# Altium footprint library MYLIB.PcbLib: 600 footprints (part 24 of 39)
Each footprint in its own frame and in the unit in brackets; x right, y up, seen from the top. Pads: shape width x height; smd on the part's side, far side on the other; paste and mask are expansions set on the pad; w line width, h text height; cw(c..) or ccw(c..) is an arc to the next point about the centre after c.
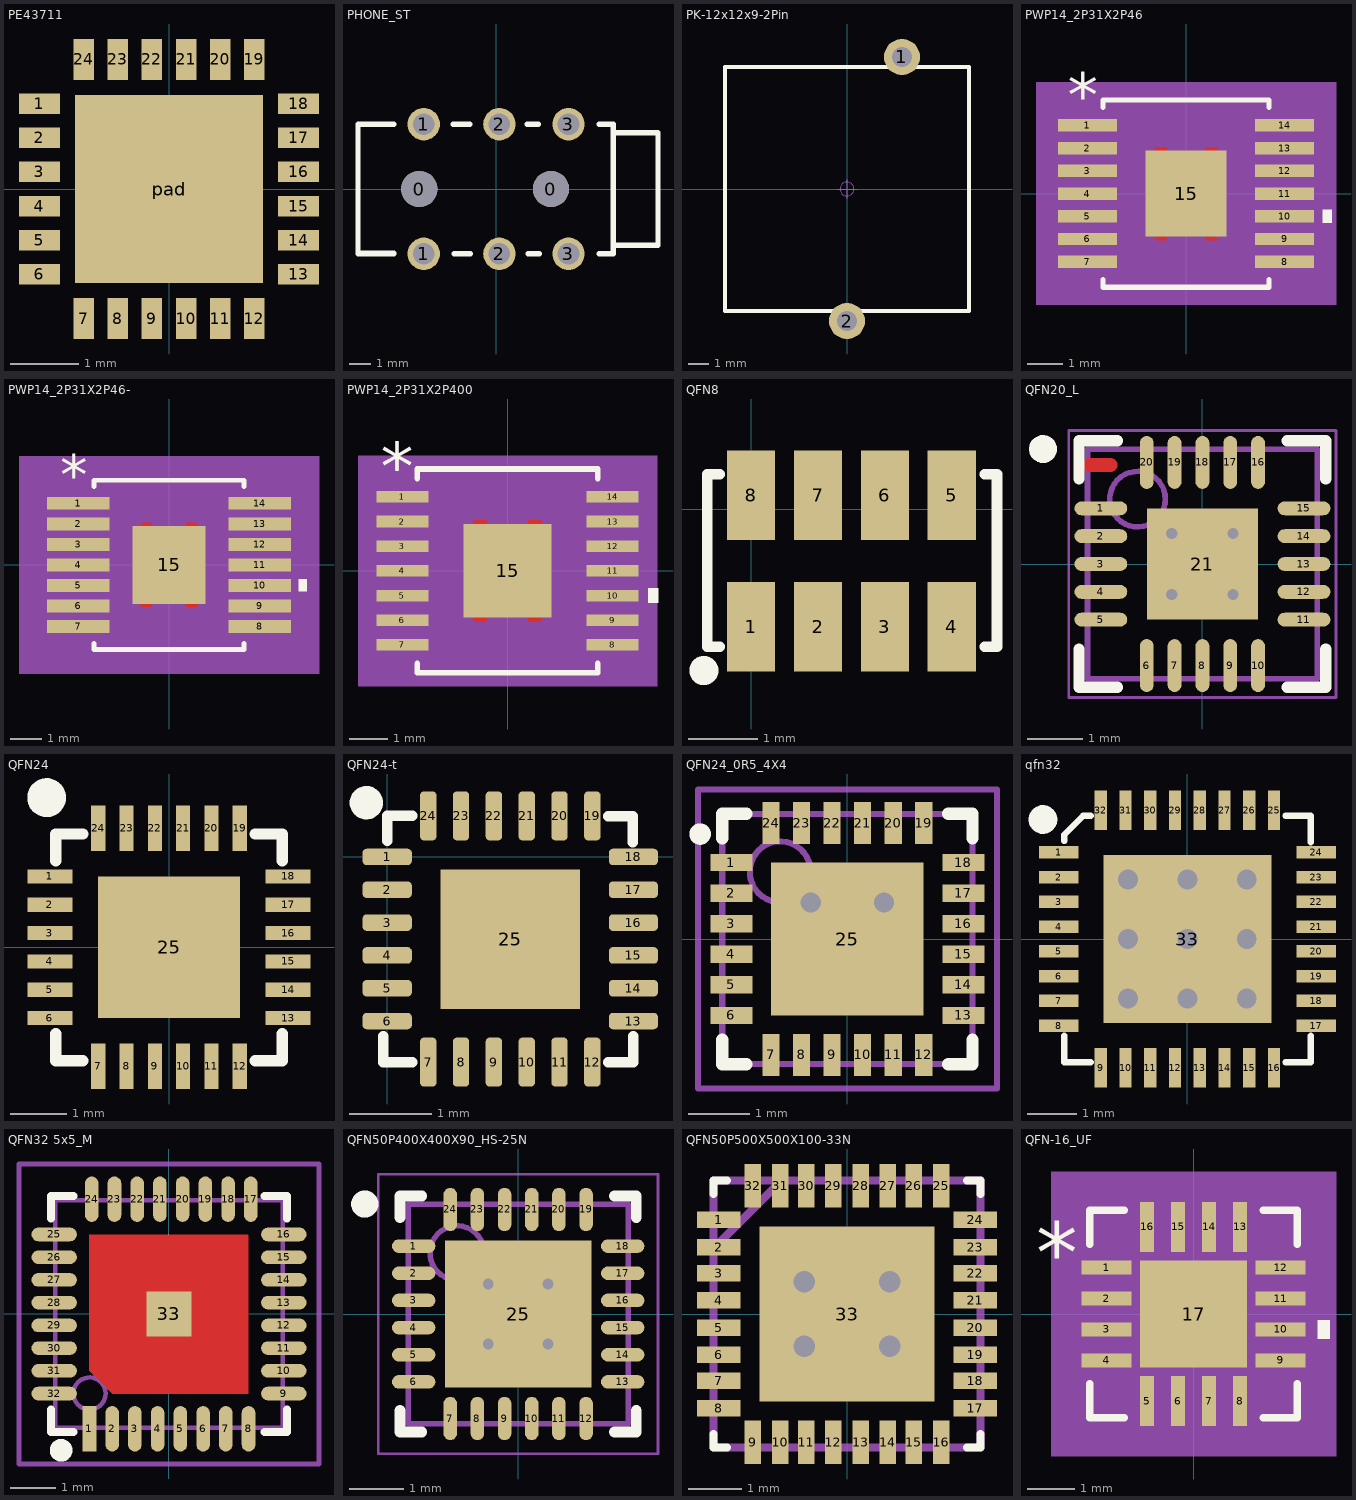
[diagram p23: the footprints below, top view; thin cyan lines are the x and y axes]

## PE43711 [mm] "5V"
pads (25):
  rect 0.6x0.3 smd: 1(-1.9,1.25) 2(-1.9,0.75) 3(-1.9,0.25) 4(-1.9,-0.25) 5(-1.9,-0.75) 6(-1.9,-1.25) 13(1.9,-1.25) 14(1.9,-0.75) 15(1.9,-0.25) 16(1.9,0.25) 17(1.9,0.75) 18(1.9,1.25)
  rect 0.3x0.6 smd: 7(-1.25,-1.9) 8(-0.75,-1.9) 9(-0.25,-1.9) 10(0.25,-1.9) 11(0.75,-1.9) 12(1.25,-1.9) 19(1.25,1.9) 20(0.75,1.9) 21(0.25,1.9) 22(-0.25,1.9) 23(-0.75,1.9) 24(-1.25,1.9)
  rect 2.75x2.75 smd: pad(0,0)

## PHONE_ST [mm]
pads (8):
  round 1.676 hole 1.676: 0(-3.556,0) 0(2.54,0)
  round 1.5 hole 1: 1(-3.35,-3) 1(-3.35,3) 2(0.15,-3) 2(0.15,3) 3(3.35,-3) 3(3.35,3)
Top Overlay:
  lines w0.254: -6.393,-2.969 -4.742,-2.969 ; -4.742,-3.007 -6.393,-3.007 -6.393,3 -4.742,3 ; -1.986,3 -1.224,3 ; -1.948,-3.007 -1.186,-3.007 ; 1.443,3 1.951,3 ; 1.481,-3.007 1.989,-3.007 ; 4.783,-3.007 5.33,-3.007 ; 4.783,3 5.418,3 5.418,-3.007 ; 5.418,-2.6 7.493,-2.6 7.493,2.6 5.418,2.6

## PK-12x12x9-2Pin [mm] "12x12x9mm"
pads (2):
  round 1.8 hole 1: 1(2.75,6.6) 2(0,-6.6)
Top Overlay:
  lines w0.203: -6.1,-6.1 6.1,-6.1 6.1,6.1 -6.1,6.1 -6.1,-6.1
Mechanical 15:
  circle w0.05: c0,0 r0.35
  lines w0.05: -0.5,0 0.5,0 ; 0,-0.5 0,0.5
3D body "PK-12X12X9-2Pin.STEP": height 9.15, standoff -2.95, extent -6,-6.85 6,6.85

## PWP14_2P31X2P46 [mil]
pads (15):
  rect 66x14 smd paste+0 mask+0: 1(-111,76.77) 2(-111,51.18) 3(-111,25.59) 4(-111,0) 5(-111,-25.59) 6(-111,-51.18) 7(-111,-76.77) 8(111,-76.77) 9(111,-51.18) 10(111,-25.59) 11(111,0) 12(111,25.59) 13(111,51.18) 14(111,76.77)
  rect 90.94x96.85 smd paste+0 mask+0: 15(0,0)
Top Layer:
  region: 35.43,-48.43 21.65,-48.43 21.65,-52.36 35.43,-52.36
  region: -35.43,-48.43 -21.65,-48.43 -21.65,-52.36 -35.43,-52.36
  region: -35.43,48.43 -21.65,48.43 -21.65,52.36 -35.43,52.36
  region: 35.43,48.43 21.65,48.43 21.65,52.36 35.43,52.36
  region: 0,-48.43
  region: 0,48.43
Top Overlay:
  region: 154,-18.09 164,-18.09 164,-33.09 154,-33.09
  lines w6: -93.5,-96.87 -93.5,-105.5 93.5,-105.5 93.5,-96.87 ; -93.5,96.87 -93.5,105.5 93.5,105.5 93.5,96.87
  text "*" at -133.5,85.77 h50
Top Paste:
  region: 45.47,48.43 -45.47,48.43 -45.47,-48.43 45.47,-48.43
Top Solder:
  region: 35.43,-48.43 21.65,-48.43 21.65,-52.36 35.43,-52.36
  region: -35.43,-48.43 -21.65,-48.43 -21.65,-52.36 -35.43,-52.36
  region: -35.43,48.43 -21.65,48.43 -21.65,52.36 -35.43,52.36
  region: 35.43,48.43 21.65,48.43 21.65,52.36 35.43,52.36
  region: 0,-48.43
  region: 0,48.43
Mechanical 5:
  region: 169,-125.5 -169,-125.5 -169,125.5 169,125.5
Mechanical 13:
  lines w0: -12,100.5 ccw(c0,100.5) 12,100.5
  lines w1: -130,-82.77 -88.5,-82.77 -88.5,-70.77 -130,-70.77 -130,-82.77 ; -130,-57.18 -88.5,-57.18 -88.5,-45.18 -130,-45.18 -130,-57.18 ; -130,-31.59 -88.5,-31.59 -88.5,-19.59 -130,-19.59 -130,-31.59 ; -130,-6 -88.5,-6 -88.5,6 -130,6 -130,-6 ; -130,19.59 -88.5,19.59 -88.5,31.59 -130,31.59 -130,19.59 ; -130,45.18 -88.5,45.18 -88.5,57.18 -130,57.18 -130,45.18 ; -130,70.77 -88.5,70.77 -88.5,82.77 -130,82.77 -130,70.77 ; -88.5,-100.5 -88.5,100.5 88.5,100.5 88.5,-100.5 -88.5,-100.5 ; 88.5,-82.77 130,-82.77 130,-70.77 88.5,-70.77 88.5,-82.77 ; 88.5,-57.18 130,-57.18 130,-45.18 88.5,-45.18 88.5,-57.18 ; 88.5,-31.59 130,-31.59 130,-19.59 88.5,-19.59 88.5,-31.59 ; 88.5,-6 130,-6 130,6 88.5,6 88.5,-6 ; 88.5,19.59 130,19.59 130,31.59 88.5,31.59 88.5,19.59 ; 88.5,45.18 130,45.18 130,57.18 88.5,57.18 88.5,45.18 ; 88.5,70.77 130,70.77 130,82.77 88.5,82.77 88.5,70.77
  text "*" at -91,40.77 h50
Mechanical 15:
  region: -98.5,-91.57 -154,-91.57 -154,91.57 -98.5,91.57 -98.5,110.5 98.5,110.5 98.5,91.57 154,91.57 154,-91.57 98.5,-91.57 98.5,-110.5 -98.5,-110.5
  lines w6: -154,-91.57 -98.5,-91.57 -98.5,-110.5 98.5,-110.5 98.5,-91.57 154,-91.57 154,91.57 98.5,91.57 98.5,110.5 -98.5,110.5 -98.5,91.57 -154,91.57 -154,-91.57
3D body: height 10, standoff 0, extent 0,0 10,10

## PWP14_2P31X2P46- [mil]
pads (15):
  rect 78x16 smd paste+0 mask+0: 1(-113,76.77) 2(-113,51.18) 3(-113,25.59) 4(-113,0) 5(-113,-25.59) 6(-113,-51.18) 7(-113,-76.77) 8(113,-76.77) 9(113,-51.18) 10(113,-25.59) 11(113,0) 12(113,25.59) 13(113,51.18) 14(113,76.77)
  rect 90.94x96.85 smd paste+0 mask+0: 15(0,0)
Top Layer:
  region: 35.43,-48.43 21.65,-48.43 21.65,-52.36 35.43,-52.36
  region: -35.43,-48.43 -21.65,-48.43 -21.65,-52.36 -35.43,-52.36
  region: -35.43,48.43 -21.65,48.43 -21.65,52.36 -35.43,52.36
  region: 35.43,48.43 21.65,48.43 21.65,52.36 35.43,52.36
  region: 0,-48.43
  region: 0,48.43
Top Overlay:
  region: 162,-18.09 172,-18.09 172,-33.09 162,-33.09
  lines w6: -93.5,-97.87 -93.5,-105.5 93.5,-105.5 93.5,-97.87 ; -93.5,97.87 -93.5,105.5 93.5,105.5 93.5,97.87
  text "*" at -135.5,87.77 h50
Top Paste:
  region: 45.47,48.43 -45.47,48.43 -45.47,-48.43 45.47,-48.43
Top Solder:
  region: 35.43,-48.43 21.65,-48.43 21.65,-52.36 35.43,-52.36
  region: -35.43,-48.43 -21.65,-48.43 -21.65,-52.36 -35.43,-52.36
  region: -35.43,48.43 -21.65,48.43 -21.65,52.36 -35.43,52.36
  region: 35.43,48.43 21.65,48.43 21.65,52.36 35.43,52.36
  region: 0,-48.43
  region: 0,48.43
Mechanical 5:
  region: 187,-135.5 -187,-135.5 -187,135.5 187,135.5
Mechanical 13:
  lines w0: -12,100.5 ccw(c0,100.5) 12,100.5
  lines w1: -130,-82.77 -88.5,-82.77 -88.5,-70.77 -130,-70.77 -130,-82.77 ; -130,-57.18 -88.5,-57.18 -88.5,-45.18 -130,-45.18 -130,-57.18 ; -130,-31.59 -88.5,-31.59 -88.5,-19.59 -130,-19.59 -130,-31.59 ; -130,-6 -88.5,-6 -88.5,6 -130,6 -130,-6 ; -130,19.59 -88.5,19.59 -88.5,31.59 -130,31.59 -130,19.59 ; -130,45.18 -88.5,45.18 -88.5,57.18 -130,57.18 -130,45.18 ; -130,70.77 -88.5,70.77 -88.5,82.77 -130,82.77 -130,70.77 ; -88.5,-100.5 -88.5,100.5 88.5,100.5 88.5,-100.5 -88.5,-100.5 ; 88.5,-82.77 130,-82.77 130,-70.77 88.5,-70.77 88.5,-82.77 ; 88.5,-57.18 130,-57.18 130,-45.18 88.5,-45.18 88.5,-57.18 ; 88.5,-31.59 130,-31.59 130,-19.59 88.5,-19.59 88.5,-31.59 ; 88.5,-6 130,-6 130,6 88.5,6 88.5,-6 ; 88.5,19.59 130,19.59 130,31.59 88.5,31.59 88.5,19.59 ; 88.5,45.18 130,45.18 130,57.18 88.5,57.18 88.5,45.18 ; 88.5,70.77 130,70.77 130,82.77 88.5,82.77 88.5,70.77
  text "*" at -91,42.77 h50
Mechanical 15:
  region: -108.5,-93.57 -172,-93.57 -172,93.57 -108.5,93.57 -108.5,120.5 108.5,120.5 108.5,93.57 172,93.57 172,-93.57 108.5,-93.57 108.5,-120.5 -108.5,-120.5
  lines w6: -172,-93.57 -108.5,-93.57 -108.5,-120.5 108.5,-120.5 108.5,-93.57 172,-93.57 172,93.57 108.5,93.57 108.5,120.5 -108.5,120.5 -108.5,93.57 -172,93.57 -172,-93.57
3D body: height 10, standoff 0, extent 0,0 10,10

## PWP14_2P31X2P400 [mil]
pads (15):
  rect 54x12 smd paste+0 mask+0: 1(-109,76.77) 2(-109,51.18) 3(-109,25.59) 4(-109,0) 5(-109,-25.59) 6(-109,-51.18) 7(-109,-76.77) 8(109,-76.77) 9(109,-51.18) 10(109,-25.59) 11(109,0) 12(109,25.59) 13(109,51.18) 14(109,76.77)
  rect 90.94x96.85 smd paste+0 mask+0: 15(0,0)
Top Layer:
  region: 0,48.43
  region: 0,-48.43
  region: 35.43,48.43 21.65,48.43 21.65,52.36 35.43,52.36
  region: -35.43,48.43 -21.65,48.43 -21.65,52.36 -35.43,52.36
  region: -35.43,-48.43 -21.65,-48.43 -21.65,-52.36 -35.43,-52.36
  region: 35.43,-48.43 21.65,-48.43 21.65,-52.36 35.43,-52.36
Top Overlay:
  region: 146,-18.09 156,-18.09 156,-33.09 146,-33.09
  lines w6: -93.5,-95.87 -93.5,-105.5 93.5,-105.5 93.5,-95.87 ; -93.5,95.87 -93.5,105.5 93.5,105.5 93.5,95.87
  text "*" at -131.5,83.77 h50
Top Paste:
  region: 45.47,48.43 -45.47,48.43 -45.47,-48.43 45.47,-48.43
Top Solder:
  region: 0,48.43
  region: 0,-48.43
  region: 35.43,48.43 21.65,48.43 21.65,52.36 35.43,52.36
  region: -35.43,48.43 -21.65,48.43 -21.65,52.36 -35.43,52.36
  region: -35.43,-48.43 -21.65,-48.43 -21.65,-52.36 -35.43,-52.36
  region: 35.43,-48.43 21.65,-48.43 21.65,-52.36 35.43,-52.36
Mechanical 5:
  region: 155,-119.5 -155,-119.5 -155,119.5 155,119.5
Mechanical 13:
  lines w0: -12,100.5 ccw(c0,100.5) 12,100.5
  lines w1: -130,-82.77 -130,-70.77 -88.5,-70.77 -88.5,-82.77 -130,-82.77 ; -130,-57.18 -130,-45.18 -88.5,-45.18 -88.5,-57.18 -130,-57.18 ; -130,-31.59 -130,-19.59 -88.5,-19.59 -88.5,-31.59 -130,-31.59 ; -130,-6 -130,6 -88.5,6 -88.5,-6 -130,-6 ; -130,19.59 -130,31.59 -88.5,31.59 -88.5,19.59 -130,19.59 ; -130,45.18 -130,57.18 -88.5,57.18 -88.5,45.18 -130,45.18 ; -130,70.77 -130,82.77 -88.5,82.77 -88.5,70.77 -130,70.77 ; -88.5,-100.5 88.5,-100.5 88.5,100.5 -88.5,100.5 -88.5,-100.5 ; 88.5,-82.77 88.5,-70.77 130,-70.77 130,-82.77 88.5,-82.77 ; 88.5,-57.18 88.5,-45.18 130,-45.18 130,-57.18 88.5,-57.18 ; 88.5,-31.59 88.5,-19.59 130,-19.59 130,-31.59 88.5,-31.59 ; 88.5,-6 88.5,6 130,6 130,-6 88.5,-6 ; 88.5,19.59 88.5,31.59 130,31.59 130,19.59 88.5,19.59 ; 88.5,45.18 88.5,57.18 130,57.18 130,45.18 88.5,45.18 ; 88.5,70.77 88.5,82.77 130,82.77 130,70.77 88.5,70.77
  text "*" at -91,38.77 h50
Mechanical 15:
  region: -92.5,-90.37 -140,-90.37 -140,90.37 -92.5,90.37 -92.5,104.5 92.5,104.5 92.5,90.37 140,90.37 140,-90.37 92.5,-90.37 92.5,-104.5 -92.5,-104.5
  lines w6: -140,-90.37 -140,90.37 -92.5,90.37 -92.5,104.5 92.5,104.5 92.5,90.37 140,90.37 140,-90.37 92.5,-90.37 92.5,-104.5 -92.5,-104.5 -92.5,-90.37 -140,-90.37
3D body: height 10, standoff 0, extent 0,0 10,10

## QFN8 [mm]
pads (8):
  rect 0.7x1.3 smd: 1(0,-1.703) 2(0.97,-1.703) 3(1.94,-1.703) 4(2.91,-1.703) 5(2.91,0.203) 6(1.94,0.203) 7(0.97,0.203) 8(0,0.203)
Top Overlay:
  circle w0.224: c-0.684,-2.337 r0.1
  lines w0.152: -0.457,-1.992 -0.635,-1.992 -0.635,0.508 -0.457,0.508 ; 3.387,-1.992 3.565,-1.992 3.565,0.508 3.387,0.508

## QFN20_L [mm] "QFN, 20-Leads, Body 4x4mm, Pitch 0.5mm, Thermal Pad 2.3x2.3mm, IPC High Density"
height 1
pads (21):
  oval 0.95x0.25 smd: 1(-1.825,1) 2(-1.825,0.5) 3(-1.825,0) 4(-1.825,-0.5) 5(-1.825,-1) 11(1.825,-1) 12(1.825,-0.5) 13(1.825,0) 14(1.825,0.5) 15(1.825,1)
  oval 0.25x0.95 smd: 6(-1,-1.825) 7(-0.5,-1.825) 8(0,-1.825) 9(0.5,-1.825) 10(1,-1.825) 16(1,1.825) 17(0.5,1.825) 18(0,1.825) 19(-0.5,1.825) 20(-1,1.825)
  rect 2x2 smd: 21(0,0)
via 0.55,-0.55 diameter 0.5 hole 0.2
via -0.55,-0.55 diameter 0.5 hole 0.2
via 0.55,0.55 diameter 0.5 hole 0.2
via -0.55,0.55 diameter 0.5 hole 0.2
Top Layer:
  lines w0.254: -2.032,1.778 -1.651,1.778
Top Overlay:
  circle w0.25: c-2.865,2.065 r0.125
  lines w0.2: -2.215,-1.525 -2.215,-2.215 -1.525,-2.215 ; -2.215,1.525 -2.215,2.215 -1.525,2.215 ; 1.525,-2.215 2.215,-2.215 2.215,-1.525 ; 1.525,2.215 2.215,2.215 2.215,1.525
Mechanical 13:
  circle w0.1: c-1.165,1.165 r0.5
  lines w0.1: -2.065,-2.065 2.065,-2.065 2.065,2.065 -2.065,2.065 -2.065,-2.065
Mechanical 15:
  lines w0.05: -2.4,-2.4 2.4,-2.4 2.4,2.4 -2.4,2.4 -2.4,-2.4
  lines w0.1: -0.5,0 0.5,0 ; 0,-0.5 0,0.5
3D body: height 1, standoff 0, extent -2.065,-2.065 2.065,2.065

## QFN24 [mm]
pads (25):
  rect 0.8x0.25 smd: 1(-2.101,1.25) 2(-2.101,0.75) 3(-2.101,0.25) 4(-2.101,-0.25) 5(-2.101,-0.75) 6(-2.101,-1.25) 13(2.101,-1.25) 14(2.101,-0.75) 15(2.101,-0.25) 16(2.101,0.25) 17(2.101,0.75) 18(2.101,1.25)
  rect 0.25x0.8 smd: 7(-1.25,-2.101) 8(-0.75,-2.101) 9(-0.25,-2.101) 10(0.25,-2.101) 11(0.75,-2.101) 12(1.25,-2.101) 19(1.25,2.101) 20(0.75,2.101) 21(0.25,2.101) 22(-0.25,2.101) 23(-0.75,2.101) 24(-1.25,2.101)
  rect 2.5x2.5 smd: 25(0,0)
Top Overlay:
  circle w0.381: c-2.159,2.642 r0.152
  lines w0.2: -2,-1.525 -2,-2 -1.525,-2 ; -2,1.525 -2,2 -1.525,2 ; 1.525,-2 2,-2 2,-1.525 ; 1.525,2 2,2 2,1.525

## QFN24-t [mm]
pads (25):
  rrect50% 0.6x0.2 smd: 1(0,0) 2(0,-0.4) 3(0,-0.8) 4(0,-1.2) 5(0,-1.6) 6(0,-2) 13(3,-2) 14(3,-1.6) 15(3,-1.2) 16(3,-0.8) 17(3,-0.4) 18(3,0)
  rrect50% 0.2x0.6 smd: 7(0.5,-2.5) 8(0.9,-2.5) 9(1.3,-2.5) 10(1.7,-2.5) 11(2.1,-2.5) 12(2.5,-2.5) 19(2.5,0.5) 20(2.1,0.5) 21(1.7,0.5) 22(1.3,0.5) 23(0.9,0.5) 24(0.5,0.5)
  rect 1.7x1.7 smd: 25(1.499,-1.003)
Top Overlay:
  circle w0.203: c-0.254,0.66 r0.102
  lines w0.127: -0.047,-2.184 -0.047,-2.5 0.305,-2.5 ; 0,0.199 0,0.5 0.305,0.5 ; 2.692,-2.5 3,-2.5 3,-2.184 ; 2.692,0.495 2.993,0.495 ; 2.993,0.178 2.993,0.483

## QFN24_0R5_4X4 [mm] "SQFN 24 Pins, Pitch 0.5mm, 4mmx4mm"
height 1
pads (25):
  rect 0.69x0.28 smd: 1(-1.9,1.25) 2(-1.9,0.75) 3(-1.9,0.25) 4(-1.9,-0.25) 5(-1.9,-0.75) 6(-1.9,-1.25) 13(1.9,-1.25) 14(1.9,-0.75) 15(1.9,-0.25) 16(1.9,0.25) 17(1.9,0.75) 18(1.9,1.25)
  rect 0.28x0.69 smd: 7(-1.25,-1.9) 8(-0.75,-1.9) 9(-0.25,-1.9) 10(0.25,-1.9) 11(0.75,-1.9) 12(1.25,-1.9) 19(1.25,1.9) 20(0.75,1.9) 21(0.25,1.9) 22(-0.25,1.9) 23(-0.75,1.9) 24(-1.25,1.9)
  rect 2.5x2.5 smd: 25(0,0)
via 0.6,0.6 diameter 0.66 hole 0.33
via -0.6,0.6 diameter 0.66 hole 0.33
Top Overlay:
  circle w0.25: c-2.413,1.719 r0.051
  lines w0.2: -2.05,-1.651 -2.05,-2.05 -1.651,-2.05 ; -2.05,1.651 -2.05,2.05 -1.651,2.05 ; 1.651,-2.05 2.05,-2.05 2.05,-1.651 ; 1.651,2.05 2.05,2.05 2.05,1.651
Mechanical 13:
  circle w0.1: c-1.1,1.1 r0.5
  lines w0.1: -2.05,-2.05 2.05,-2.05 2.05,2.05 -2.05,2.05 -2.05,-2.05
Mechanical 15:
  lines w0.1: -0.5,0 0.5,0 ; 0,-0.5 0,0.5 ; -2.45,-2.45 2.45,-2.45 2.45,2.45 -2.45,2.45 -2.45,-2.45
3D body: height 1, standoff 0.02, extent -2.05,-2.05 2.05,2.05

## qfn32 [mm]
pads (33):
  rect 0.8x0.25 smd: 1(-2.601,1.75) 2(-2.601,1.25) 3(-2.601,0.75) 4(-2.601,0.25) 5(-2.601,-0.25) 6(-2.601,-0.75) 7(-2.601,-1.25) 8(-2.601,-1.75) 17(2.601,-1.75) 18(2.601,-1.25) 19(2.601,-0.75) 20(2.601,-0.25) 21(2.601,0.25) 22(2.601,0.75) 23(2.601,1.25) 24(2.601,1.75)
  rect 0.25x0.8 smd: 9(-1.75,-2.601) 10(-1.25,-2.601) 11(-0.75,-2.601) 12(-0.25,-2.601) 13(0.25,-2.601) 14(0.75,-2.601) 15(1.25,-2.601) 16(1.75,-2.601) 25(1.75,2.601) 26(1.25,2.601) 27(0.75,2.601) 28(0.25,2.601) 29(-0.25,2.601) 30(-0.75,2.601) 31(-1.25,2.601) 32(-1.75,2.601)
  rect 3.4x3.4 smd: 33(0,0)
via 1.2,-1.2 diameter 0.7 hole 0.4
via 0,-1.2 diameter 0.7 hole 0.4
via -1.2,-1.2 diameter 0.7 hole 0.4
via 1.2,0 diameter 0.7 hole 0.4
via 0,0 diameter 0.7 hole 0.4
via -1.2,0 diameter 0.7 hole 0.4
via 1.2,1.2 diameter 0.7 hole 0.4
via 0,1.2 diameter 0.7 hole 0.4
via -1.2,1.2 diameter 0.7 hole 0.4
Top Overlay:
  circle w0.3: c-2.919,2.413 r0.14
  lines w0.127: -2.489,-1.956 -2.489,-2.489 -1.956,-2.489 ; -2.489,1.981 -2.489,2.108 -2.108,2.489 -1.956,2.489 ; 1.981,-2.489 2.489,-2.489 2.489,-1.956 ; 1.981,2.489 2.489,2.489 2.489,1.956
Mechanical 15:
  lines w0.1: -0.5,0 0.5,0 ; 0,-0.5 0,0.5

## QFN32 5x5_M [mm] "32脚，长x宽x高：5x5x0.95mm，脚距：0.5mm"
pads (33):
  rect 0.3x1 smd: 1(-1.751,-2.528)
  oval 0.3x1 smd: 2(-1.25,-2.528) 3(-0.75,-2.528) 4(-0.25,-2.528) 5(0.25,-2.528) 6(0.75,-2.528) 7(1.25,-2.528) 8(1.75,-2.528) 17(1.8,2.528) 18(1.3,2.528) 19(0.8,2.528) 20(0.3,2.528) 21(-0.2,2.528) 22(-0.7,2.528) 23(-1.2,2.528) 24(-1.7,2.528)
  oval 1x0.3 smd: 9(2.528,-1.75) 10(2.528,-1.25) 11(2.528,-0.75) 12(2.528,-0.25) 13(2.528,0.25) 14(2.528,0.75) 15(2.528,1.25) 16(2.528,1.75) 25(-2.528,1.75) 26(-2.528,1.25) 27(-2.528,0.75) 28(-2.528,0.25) 29(-2.528,-0.25) 30(-2.528,-0.75) 31(-2.528,-1.25) 32(-2.528,-1.75)
  rect 1x1 smd: 33(0,0)
Top Layer:
  region: -1.75,1.75 1.75,1.75 1.75,-1.75 -1.25,-1.75 -1.75,-1.25
Top Overlay:
  circle w0.25: c-2.375,-3 r0.125
  lines w0.178: -2.6,-2.1 -2.6,-2.6 -2.1,-2.6 ; -2.6,2.1 -2.6,2.6 -2.1,2.6 ; 2.1,-2.6 2.6,-2.6 2.6,-2.1 ; 2.1,2.6 2.6,2.6 2.6,2.1
Mechanical 13:
  circle w0.1: c-1.75,-1.75 r0.354
  lines w0.1: 2.501,-2.501 -2.501,-2.501 -2.501,2.501 2.5,2.501 2.5,-2.501 ; 2.5,-2.501 2.501,-2.501
Mechanical 15:
  circle w0.05: c0,0 r0.35
  lines w0.05: -0.5,0 0.5,0 ; 0,-0.5 0,0.5
  lines w0.1: -3.302,-3.302 3.302,-3.302 3.302,3.302 -3.302,3.302 -3.302,-3.302
3D body "QFN32 5x5.STEP": height 0.93, standoff 0, extent -2.501,-2.501 2.501,2.501

## QFN50P400X400X90_HS-25N [mm] "QFN, 24-Leads, Body 4.00x4.00mm, Pitch 0.50mm, Thermal Pad 2.70x2.70mm, IPC Medium Density"
height 0.9
pads (25):
  oval 0.8x0.25 smd: 1(-1.925,1.25) 2(-1.925,0.75) 3(-1.925,0.25) 4(-1.925,-0.25) 5(-1.925,-0.75) 6(-1.925,-1.25) 13(1.925,-1.25) 14(1.925,-0.75) 15(1.925,-0.25) 16(1.925,0.25) 17(1.925,0.75) 18(1.925,1.25)
  oval 0.25x0.8 smd: 7(-1.25,-1.925) 8(-0.75,-1.925) 9(-0.25,-1.925) 10(0.25,-1.925) 11(0.75,-1.925) 12(1.25,-1.925) 19(1.25,1.925) 20(0.75,1.925) 21(0.25,1.925) 22(-0.25,1.925) 23(-0.75,1.925) 24(-1.25,1.925)
  rect 2.7x2.7 smd: 25(0,0)
via -0.55,0.55 diameter 0.5 hole 0.2
via 0.55,0.55 diameter 0.5 hole 0.2
via -0.55,-0.55 diameter 0.5 hole 0.2
via 0.55,-0.55 diameter 0.5 hole 0.2
Top Overlay:
  circle w0.25: c-2.825,2.025 r0.125
  lines w0.2: -2.175,-1.775 -2.175,-2.175 -1.775,-2.175 ; -2.175,1.775 -2.175,2.175 -1.775,2.175 ; 1.775,-2.175 2.175,-2.175 2.175,-1.775 ; 1.775,2.175 2.175,2.175 2.175,1.775
Mechanical 13:
  circle w0.1: c-1.125,1.125 r0.5
  lines w0.1: -2.025,-2.025 -2.025,2.025 2.025,2.025 2.025,-2.025 -2.025,-2.025
Mechanical 15:
  lines w0.05: -2.575,-2.575 -2.575,2.575 2.575,2.575 2.575,-2.575 -2.575,-2.575
  lines w0.1: -0.5,0 0.5,0 ; 0,-0.5 0,0.5
3D body: height 0.9, standoff 0.05, extent -2.025,-2.025 2.025,2.025

## QFN50P500X500X100-33N [mil]
pads (33):
  rect 32x12 smd: 1(-94,69) 2(-94,49) 3(-94,30) 4(-94,10) 5(-94,-10) 6(-94,-30) 7(-94,-49) 8(-94,-69) 17(94,-69) 18(94,-49) 19(94,-30) 20(94,-10) 21(94,10) 22(94,30) 23(94,49) 24(94,69)
  rect 12x32 smd: 9(-69,-94) 10(-49,-94) 11(-30,-94) 12(-10,-94) 13(10,-94) 14(30,-94) 15(49,-94) 16(69,-94) 25(69,94) 26(49,94) 27(30,94) 28(10,94) 29(-10,94) 30(-30,94) 31(-49,94) 32(-69,94)
  rect 128x128 smd: 33(0,0)
via 31.5,-23.62 diameter 27.56 hole 15.75
via -31.5,-23.62 diameter 27.56 hole 15.75
via 31.5,23.62 diameter 27.56 hole 15.75
via -31.5,23.62 diameter 27.56 hole 15.75
Top Overlay:
  lines w6: -98,-88 -98,-98 -88,-98 ; -98,88 -98,98 -88,98 ; 88,-98 98,-98 98,-88 ; 88,98 98,98 98,88
Mechanical 13:
  lines w6: -98,-75 -98,-63 ; -98,-55 -98,-43 ; -98,-36 -98,-24 ; -98,-16 -98,-4 ; -98,4 -98,16 ; -98,24 -98,36 ; -98,43 -98,55 ; -98,48 -48,98 ; -98,63 -98,75 ; -75,-98 -63,-98 ; -75,98 -63,98 ; -55,-98 -43,-98 ; -55,98 -43,98 ; -36,-98 -24,-98 ; -36,98 -24,98 ; -16,-98 -4,-98 ; -16,98 -4,98 ; 4,-98 16,-98 ; 4,98 16,98 ; 24,-98 36,-98 ; 24,98 36,98 ; 43,-98 55,-98 ; 43,98 55,98 ; 63,-98 75,-98 ; 63,98 75,98 ; 98,-75 98,-63 ; 98,-55 98,-43 ; 98,-36 98,-24 ; 98,-16 98,-4 ; 98,4 98,16 ; 98,24 98,36 ; 98,43 98,55 ; 98,63 98,75 ; -98,-98 98,-98 98,98 -98,98 -98,-98

## QFN-16_UF [mm]
pads (17):
  rect 1.055x0.299 smd paste+0 mask+0: 1(-1.827,0.975) 2(-1.827,0.325) 3(-1.827,-0.325) 4(-1.827,-0.975) 9(1.827,-0.975) 10(1.827,-0.325) 11(1.827,0.325) 12(1.827,0.975)
  rect 0.299x1.055 smd paste+0 mask+0: 5(-0.975,-1.827) 6(-0.325,-1.827) 7(0.325,-1.827) 8(0.975,-1.827) 13(0.975,1.827) 14(0.325,1.827) 15(-0.325,1.827) 16(-0.975,1.827)
  rect 2.25x2.25 smd paste-1.112 mask+0: 17(0,0)
Top Overlay:
  region: 2.609,-0.135 2.863,-0.135 2.863,-0.516 2.609,-0.516
  lines w0.152: -2.177,-1.457 -2.177,-2.177 -1.457,-2.177 ; -2.177,1.457 -2.177,2.177 -1.457,2.177 ; 1.457,-2.177 2.177,-2.177 2.177,-1.457 ; 1.457,2.177 2.177,2.177 2.177,1.457
  text "*" at -3.307,0.665 h1.27
Top Paste:
  region: 1.125,1.125 -1.125,1.125 -1.125,-1.125 1.125,-1.125
Mechanical 5:
  region: 2.99,-2.99 -2.99,-2.99 -2.99,2.99 2.99,2.99
Mechanical 13:
  lines w0.025: -2.05,0.78 -0.78,2.05 ; -2.05,-2.05 -2.05,2.05 2.05,2.05 2.05,-2.05 -2.05,-2.05 ; -2.05,-1.15 -2.05,-0.8 -2.05,-1.15 ; -2.05,-0.5 -2.05,-0.15 -2.05,-0.5 ; -2.05,0.15 -2.05,0.5 -2.05,0.15 ; -2.05,0.8 -2.05,1.15 -2.05,0.8 ; -1.15,-2.05 -0.8,-2.05 -1.15,-2.05 ; -1.15,2.05 -0.8,2.05 -1.15,2.05 ; -0.5,-2.05 -0.15,-2.05 -0.5,-2.05 ; -0.5,2.05 -0.15,2.05 -0.5,2.05 ; 0.15,-2.05 0.5,-2.05 0.15,-2.05 ; 0.15,2.05 0.5,2.05 0.15,2.05 ; 0.8,-2.05 1.15,-2.05 0.8,-2.05 ; 0.8,2.05 1.15,2.05 0.8,2.05 ; 2.05,-1.15 2.05,-0.8 2.05,-1.15 ; 2.05,-0.5 2.05,-0.15 2.05,-0.5 ; 2.05,0.15 2.05,0.5 2.05,0.15 ; 2.05,0.8 2.05,1.15 2.05,0.8
  text "*" at -1.617,0.665 h1.27
Mechanical 15:
  region: -1.379,-2.304 -2.304,-2.304 -2.304,-1.379 -2.609,-1.379 -2.609,1.379 -2.304,1.379 -2.304,2.304 -1.379,2.304 -1.379,2.609 1.379,2.609 1.379,2.304 2.304,2.304 2.304,1.379 2.609,1.379 2.609,-1.379 2.304,-1.379 2.304,-2.304 1.379,-2.304 1.379,-2.609 -1.379,-2.609
  lines w0.152: -2.609,-1.379 -2.609,1.379 -2.304,1.379 -2.304,2.304 -1.379,2.304 -1.379,2.609 1.379,2.609 1.379,2.304 2.304,2.304 2.304,1.379 2.609,1.379 2.609,-1.379 2.304,-1.379 2.304,-2.304 1.379,-2.304 1.379,-2.609 -1.379,-2.609 -1.379,-2.304 -2.304,-2.304 -2.304,-1.379 -2.609,-1.379
3D body: height 0.25, standoff 0, extent 0,0 0.254,0.254